# Altium footprint library IC.PcbLib: 163 footprints (part 2 of 11)
Each footprint in its own frame and in the unit in brackets; x right, y up, seen from the top. Pads: shape width x height; smd on the part's side, far side on the other; paste and mask are expansions set on the pad; w line width, h text height; cw(c..) or ccw(c..) is an arc to the next point about the centre after c.
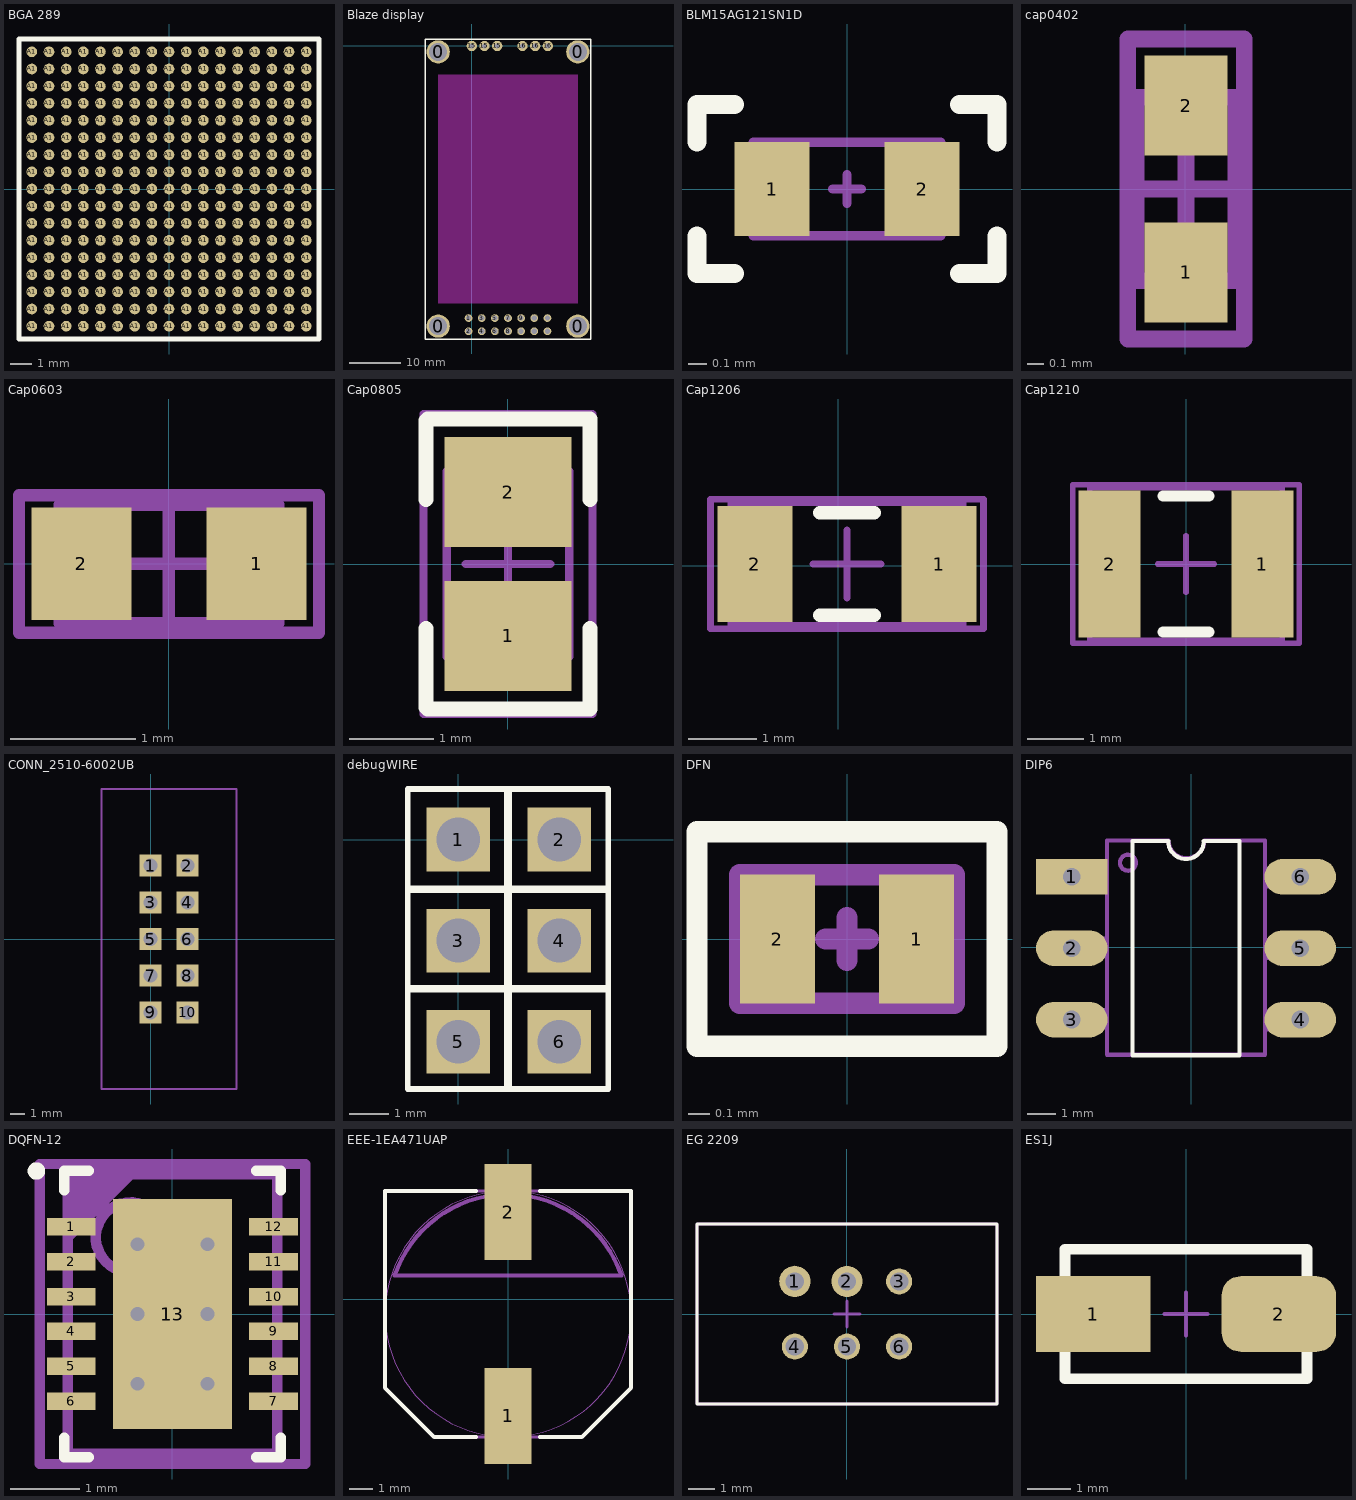
[diagram p1: the footprints below, top view; thin cyan lines are the x and y axes]

## BGA 289 [mm] "0.8mm pitch"
pads (289):
  round 0.5 smd: A1(-6.4,6.4) A1(-6.4,4.8) A1(-6.4,5.6) A1(-6.4,4) A1(-6.4,2.4) A1(-6.4,3.2) A1(-6.4,1.6) A1(-6.4,0.8) A1(-6.4,0) A1(-6.4,-1.6) A1(-6.4,-0.8) A1(-6.4,-2.4) A1(-6.4,-3.2) A1(-6.4,-4.8) A1(-6.4,-4) A1(-6.4,-5.6) A1(-6.4,-6.4) A1(-5.6,6.4) A1(-5.6,4.8) A1(-5.6,5.6) A1(-5.6,4) A1(-5.6,2.4) A1(-5.6,3.2) A1(-5.6,1.6) A1(-5.6,0) A1(-5.6,0.8) A1(-5.6,-0.8) A1(-5.6,-2.4) A1(-5.6,-1.6) A1(-5.6,-3.2) A1(-5.6,-4.8) A1(-5.6,-4) A1(-5.6,-5.6) A1(-5.6,-6.4) A1(-4.8,6.4) A1(-4.8,5.6) A1(-4.8,4) A1(-4.8,4.8) A1(-4.8,3.2) A1(-4.8,2.4) A1(-4.8,1.6) A1(-4.8,0) A1(-4.8,0.8) A1(-4.8,-0.8) A1(-4.8,-2.4) A1(-4.8,-1.6) A1(-4.8,-3.2) A1(-4.8,-4) A1(-4.8,-5.6) A1(-4.8,-4.8) A1(-4.8,-6.4) A1(-4,6.4) A1(-4,5.6) A1(-4,4) A1(-4,4.8) A1(-4,2.4) A1(-4,3.2) A1(-4,1.6) A1(-4,0.8) A1(-4,-0.8) A1(-4,0) A1(-4,-1.6) A1(-4,-2.4) A1(-4,-3.2) A1(-4,-4) A1(-4,-5.6) A1(-4,-4.8) A1(-4,-6.4) A1(-3.2,6.4) A1(-3.2,5.6) A1(-3.2,4.8) A1(-3.2,3.2) A1(-3.2,4) A1(-3.2,1.6) A1(-3.2,2.4) A1(-3.2,0.8) A1(-3.2,0) A1(-3.2,-1.6) A1(-3.2,-0.8) A1(-3.2,-2.4) A1(-3.2,-4) A1(-3.2,-3.2) A1(-3.2,-4.8) A1(-3.2,-5.6) A1(-3.2,-6.4) A1(-2.4,6.4) A1(-2.4,5.6) A1(-2.4,4.8) A1(-2.4,3.2) A1(-2.4,4) A1(-2.4,1.6) A1(-2.4,2.4) A1(-2.4,0.8) A1(-2.4,0) A1(-2.4,-1.6) A1(-2.4,-0.8) A1(-2.4,-2.4) A1(-2.4,-3.2) A1(-2.4,-4) A1(-2.4,-4.8) A1(-2.4,-6.4) A1(-2.4,-5.6) A1(-1.6,6.4) A1(-1.6,4.8) A1(-1.6,5.6) A1(-1.6,4) A1(-1.6,2.4) A1(-1.6,3.2) A1(-1.6,1.6) A1(-1.6,0) A1(-1.6,0.8) A1(-1.6,-0.8) A1(-1.6,-2.4) A1(-1.6,-1.6) A1(-1.6,-3.2) A1(-1.6,-4.8) A1(-1.6,-4) A1(-1.6,-5.6) A1(-1.6,-6.4) A1(-0.8,6.4) A1(-0.8,4.8) A1(-0.8,5.6) A1(-0.8,4) A1(-0.8,2.4) A1(-0.8,3.2) A1(-0.8,1.6) A1(-0.8,0) A1(-0.8,0.8) A1(-0.8,-0.8) A1(-0.8,-2.4) A1(-0.8,-1.6) A1(-0.8,-3.2) A1(-0.8,-4.8) A1(-0.8,-4) A1(-0.8,-5.6) A1(-0.8,-6.4) A1(0,6.4) A1(0,5.6) A1(0,4) A1(0,4.8) A1(0,3.2) A1(0,1.6) A1(0,2.4) A1(0,0.8) A1(0,-0.8) A1(0,0) A1(0,-1.6) A1(0,-2.4) A1(0,-3.2) A1(0,-4) A1(0,-5.6) A1(0,-4.8) A1(0,-6.4) A1(0.8,6.4) A1(0.8,5.6) A1(0.8,4) A1(0.8,4.8) A1(0.8,2.4) A1(0.8,3.2) A1(0.8,1.6) A1(0.8,0.8) A1(0.8,-0.8) A1(0.8,0) A1(0.8,-2.4) A1(0.8,-1.6) A1(0.8,-3.2) A1(0.8,-4) A1(0.8,-5.6) A1(0.8,-4.8) A1(0.8,-6.4) A1(1.6,6.4) A1(1.6,5.6) A1(1.6,4.8) A1(1.6,3.2) A1(1.6,4) A1(1.6,2.4) A1(1.6,0.8) A1(1.6,1.6) A1(1.6,0) A1(1.6,-0.8) A1(1.6,-2.4) A1(1.6,-1.6) A1(1.6,-3.2) A1(1.6,-4.8) A1(1.6,-4) A1(1.6,-5.6) A1(1.6,-6.4) A1(2.4,6.4) A1(2.4,5.6) A1(2.4,4.8) A1(2.4,3.2) A1(2.4,4) A1(2.4,2.4) A1(2.4,1.6) A1(2.4,0) A1(2.4,0.8) A1(2.4,-1.6) A1(2.4,-0.8) A1(2.4,-2.4) A1(2.4,-3.2) A1(2.4,-4.8) A1(2.4,-4) A1(2.4,-6.4) A1(2.4,-5.6) A1(3.2,6.4) A1(3.2,4.8) A1(3.2,5.6) A1(3.2,4) A1(3.2,2.4) A1(3.2,3.2) A1(3.2,1.6) A1(3.2,0.8) A1(3.2,0) A1(3.2,-1.6) A1(3.2,-0.8) A1(3.2,-2.4) A1(3.2,-3.2) A1(3.2,-4) A1(3.2,-4.8) A1(3.2,-6.4) A1(3.2,-5.6) A1(4,6.4) A1(4,4.8) A1(4,5.6) A1(4,4) A1(4,2.4) A1(4,3.2) A1(4,1.6) A1(4,0) A1(4,0.8) A1(4,-0.8) A1(4,-2.4) A1(4,-1.6) A1(4,-3.2) A1(4,-4.8) A1(4,-4) A1(4,-5.6) A1(4,-6.4) A1(4.8,6.4) A1(4.8,5.6) A1(4.8,4) A1(4.8,4.8) A1(4.8,3.2) A1(4.8,2.4) A1(4.8,1.6) A1(4.8,0) A1(4.8,0.8) A1(4.8,-0.8) A1(4.8,-2.4) A1(4.8,-1.6) A1(4.8,-3.2) A1(4.8,-4.8) A1(4.8,-4) A1(4.8,-5.6) A1(4.8,-6.4) A1(5.6,6.4) A1(5.6,5.6) A1(5.6,4) A1(5.6,4.8) A1(5.6,2.4) A1(5.6,3.2) A1(5.6,1.6) A1(5.6,0.8) A1(5.6,-0.8) A1(5.6,0) A1(5.6,-1.6) A1(5.6,-2.4) A1(5.6,-3.2) A1(5.6,-4) A1(5.6,-5.6) A1(5.6,-4.8) A1(5.6,-6.4) A1(6.4,5.6) A1(6.4,6.4) A1(6.4,4.8) A1(6.4,4) A1(6.4,2.4) A1(6.4,3.2) A1(6.4,1.6) A1(6.4,0.8) A1(6.4,-0.8) A1(6.4,0) A1(6.4,-1.6) A1(6.4,-2.4) A1(6.4,-3.2) A1(6.4,-4) A1(6.4,-5.6) A1(6.4,-4.8) A1(6.4,-6.4)
Top Overlay:
  lines w0.254: -7,-7 -7,7 7,7 7,-7 -7,-7

## Blaze display [mm]
pads (24):
  round 4.5 hole 3.5: 0(-6.5,-54.15) 0(-6.5,-1.15) 0(20.5,-54.15) 0(20.5,-1.15)
  round 1.5 hole 1: 1(-0.62,-52.61) 2(-0.62,-55.15) 3(1.92,-52.61) 4(1.92,-55.15) 5(4.46,-52.61) 6(4.46,-55.15) 7(7,-52.61) 8(7,-55.15) 9(9.54,-52.61) 10(9.54,-55.15) 11(12.08,-52.61) 12(12.08,-55.15) 13(14.62,-52.61) 14(14.62,-55.15)
  round 2 hole 1: 15(0,0) 15(2.45,0) 15(4.9,0) 16(9.8,0) 16(12.25,0) 16(14.7,0)
Top Overlay:
  lines w0.254: -9,-56.65 23,-56.65 23,1.35 -9,1.35 -9,-56.65
Keep-Out Layer:
  rectangle: -6.5,-49.75 20.5,-5.55
3D body: height 5, standoff 4, extent -9,-56.65 23,1.35
3D body: height 11, standoff -5, extent -6.5,-49.75 20.5,-5.55
3D body: height 11, standoff -5, extent 1.25,-41.562 12.75,-13.737

## BLM15AG121SN1D [mm]
pads (2):
  rect 0.4x0.5 smd: 1(-0.4,0) 2(0.4,0)
Top Overlay:
  lines w0.1: -0.8,-0.25 -0.8,-0.45 -0.6,-0.45 ; -0.8,0.25 -0.8,0.45 -0.6,0.45 ; 0.6,-0.45 0.8,-0.45 0.8,-0.25 ; 0.6,0.45 0.8,0.45 0.8,0.25
Mechanical 32:
  lines w0.05: -0.075,0 0.075,0 ; 0,-0.075 0,0.075 ; -0.5,-0.25 -0.5,0.25 0.5,0.25 0.5,-0.25 -0.5,-0.25
3D body: height 0.65, standoff 0.1, extent -0.5,-0.25 0.5,0.25

## cap0402 [mm]
pads (2):
  rect 0.5x0.6 smd: 1(0.004,-0.5) 2(0.004,0.5)
Mechanical 13:
  lines w0.1: -0.296,-0.55 -0.296,0.55 0.304,0.55 0.304,-0.55 -0.296,-0.55
Mechanical 15:
  lines w0.1: -0.296,0 0.304,0 ; 0.004,-0.3 0.004,0.3 ; -0.346,-0.9 -0.346,0.9 0.354,0.9 0.354,-0.9 -0.346,-0.9
3D body: height 1.3, standoff 0, extent -0.296,-0.55 0.304,0.55

## Cap0603 [mm]
pads (2):
  rect 0.8x0.9 smd: 1(0.7,0) 2(-0.7,0)
Mechanical 13:
  lines w0.1: -0.875,-0.475 0.875,-0.475 0.875,0.475 -0.875,0.475 -0.875,-0.475
Mechanical 15:
  lines w0.1: -0.475,0 0.475,0 ; 0,-0.475 0,0.475 ; -1.2,-0.55 1.2,-0.55 1.2,0.55 -1.2,0.55 -1.2,-0.55
3D body: height 1.3, standoff 0, extent -0.875,-0.475 0.875,0.475

## Cap0805 [mm]
pads (2):
  rect 1.5x1.3 smd: 1(0,-0.85) 2(0,0.85)
Top Overlay:
  lines w0.178: -0.968,-0.762 -0.968,-1.699 -0.95,-1.717 0.968,-1.717 0.968,-0.762 ; -0.968,0.762 -0.968,1.699 -0.95,1.717 0.968,1.717 0.968,0.762
Mechanical 5:
  lines w0.1: -1,-1.775 1,-1.775 1,1.775 -1,1.775 -1,-1.775
Mechanical 13:
  lines w0.1: -0.725,-0.65 0.725,-0.65 ; -0.725,0.65 0.725,0.65 ; -0.725,-1.1 0.725,-1.1 0.725,1.1 -0.725,1.1 -0.725,-1.1
Mechanical 15:
  lines w0.1: -0.5,0 0.5,0 ; 0,-0.5 0,0.5 ; -1,-1.775 1,-1.775 1,1.775 -1,1.775 -1,-1.775
3D body: height 1.1, standoff 0, extent -0.724,0.651 0.724,1.099
3D body: height 1.1, standoff 0, extent -0.724,-0.649 0.724,0.649
3D body: height 1.1, standoff 0, extent -0.724,-1.099 0.724,-0.651

## Cap1206 [mm]
pads (2):
  rect 1.1x1.7 smd: 1(1.475,0.025) 2(-1.225,0.025)
Top Overlay:
  lines w0.2: -0.275,-0.725 0.525,-0.725 ; -0.275,0.775 0.525,0.775
Mechanical 13:
  lines w0.1: -1.575,-0.875 -1.575,0.925 1.825,0.925 1.825,-0.875 -1.575,-0.875
Mechanical 15:
  lines w0.1: -0.375,0.025 0.625,0.025 ; 0.125,-0.475 0.125,0.525 ; -1.875,-0.925 -1.875,0.975 2.125,0.975 2.125,-0.925 -1.875,-0.925
3D body: height 1.3, standoff 0, extent -1.575,-0.875 1.825,0.925

## Cap1210 [mm]
pads (2):
  rect 1.1x2.6 smd: 1(1.35,0) 2(-1.35,0)
Top Overlay:
  lines w0.2: -0.4,-1.2 0.4,-1.2 ; -0.4,1.2 0.4,1.2
Mechanical 13:
  lines w0.1: -1.7,-1.35 1.7,-1.35 1.7,1.35 -1.7,1.35 -1.7,-1.35
Mechanical 15:
  lines w0.1: -0.5,0 0.5,0 ; 0,-0.5 0,0.5 ; -2,-1.4 2,-1.4 2,1.4 -2,1.4 -2,-1.4
3D body: height 1.3, standoff 0, extent -1.7,-1.35 1.7,1.35

## CONN_2510-6002UB [mil]
pads (10):
  rect 60x60 hole 38: 1(0,200) 2(100,200) 3(0,100) 4(100,100) 5(0,0) 6(100,0) 7(0,-100) 8(100,-100) 9(0,-200) 10(100,-200)
Mechanical 5:
  lines w5: -134,-409 234,-409 234,409 -134,409 -134,-409
  text "*" at -85,249 h40
  text ".Designator" at 31,77 h40

## debugWIRE [mm]
pads (6):
  rect 1.6x1.6 hole 1.1: 1(0,0) 2(2.54,0) 3(0,-2.54) 4(2.54,-2.54) 5(0,-5.08) 6(2.54,-5.08)
Top Overlay:
  lines w0.15: -1.27,-6.27 1.27,-6.27 1.27,-3.73 -1.27,-3.73 -1.27,-6.27 ; -1.27,-3.77 1.27,-3.77 1.27,-1.23 -1.27,-1.23 -1.27,-3.77 ; -1.27,-1.27 1.27,-1.27 1.27,1.27 -1.27,1.27 -1.27,-1.27 ; 1.23,-6.27 3.77,-6.27 3.77,-3.73 1.23,-3.73 1.23,-6.27 ; 1.23,-3.77 3.77,-3.77 3.77,-1.23 1.23,-1.23 1.23,-3.77 ; 1.23,-1.27 3.77,-1.27 3.77,1.27 1.23,1.27 1.23,-1.27
3D body "PLS-1.STEP": height 8.5, standoff -3, extent 1.23,-6.27 3.77,-3.73
3D body "PLS-1.STEP": height 8.5, standoff -3, extent -1.27,-6.27 1.27,-3.73
3D body "PLS-1.STEP": height 8.5, standoff -3, extent 1.23,-3.77 3.77,-1.23
3D body "PLS-1.STEP": height 8.5, standoff -3, extent -1.27,-3.77 1.27,-1.23
3D body "PLS-1.STEP": height 8.5, standoff -3, extent 1.23,-1.27 3.77,1.27
3D body "PLS-1.STEP": height 8.5, standoff -3, extent -1.27,-1.27 1.27,1.27

## DFN [mm]
pads (2):
  rect 0.35x0.6 smd: 1(0.325,0) 2(-0.325,0)
Top Overlay:
  lines w0.1: -0.7,-0.5 0.7,-0.5 0.7,0.5 -0.7,0.5 -0.7,-0.5
Mechanical 32:
  lines w0.1: -0.1,0 0.1,0 ; 0,-0.1 0,0.1 ; -0.5,-0.3 0.5,-0.3 0.5,0.3 -0.5,0.3 -0.5,-0.3
3D body: height 0.4, standoff 0.1, extent -0.5,-0.3 0.5,0.3

## DIP6 [mm]
pads (6):
  rect 2.54x1.27 hole 0.635: 1(-4.25,2.5)
  oval 2.54x1.27 hole 0.635: 2(-4.25,-0.04) 3(-4.25,-2.58) 4(3.878,-2.58) 5(3.878,-0.04) 6(3.878,2.5)
Top Overlay:
  lines w0.15: -2.091,-3.85 -2.091,3.77 -0.821,3.77 ccw(c-0.186,3.77) 0.449,3.77 1.719,3.77 1.719,-3.85 -2.091,-3.85
Mechanical 29:
  circle w0.15: c-2.25,3 r0.283
  lines w0.15: -2.997,-2.86 -4.822,-2.86 -4.822,-2.235 -2.997,-2.235 ; -2.997,-0.32 -4.822,-0.32 -4.822,0.305 -2.997,0.305 ; -2.997,2.22 -4.822,2.22 -4.822,2.845 -2.997,2.845 ; 2.625,-2.925 4.45,-2.925 4.45,-2.3 2.625,-2.3 ; 2.625,-0.385 4.45,-0.385 4.45,0.24 2.625,0.24 ; 2.625,2.155 4.45,2.155 4.45,2.78 2.625,2.78 ; -2.997,-3.83 -2.997,3.79 -0.806,3.79 ccw(c-0.171,3.79) 0.464,3.79 2.625,3.79 2.625,-3.83 -2.997,-3.83
  text ".Designator" at -2.55,-0.3 h1
3D body "User Library-DIP6.STEP": height 4.8, standoff -2.5, extent -4.121,-3.604 3.749,3.516

## DQFN-12 [mm] "SON, 12-Leads, Body 4x3mm, Pitch 0.5mm, Thermal Pad 3.3x1.7mm"
height 0.8
pads (13):
  rect 0.7x0.25 smd: 1(-1.45,1.25) 2(-1.45,0.75) 3(-1.45,0.25) 4(-1.45,-0.25) 5(-1.45,-0.75) 6(-1.45,-1.25) 7(1.45,-1.25) 8(1.45,-0.75) 9(1.45,-0.25) 10(1.45,0.25) 11(1.45,0.75) 12(1.45,1.25)
  rect 1.7x3.3 smd: 13(0,0)
via -0.5,1 diameter 0.5 hole 0.2
via 0.5,1 diameter 0.5 hole 0.2
via -0.5,0 diameter 0.5 hole 0.2
via 0.5,0 diameter 0.5 hole 0.2
via -0.5,-1 diameter 0.5 hole 0.2
via 0.5,-1 diameter 0.5 hole 0.2
Top Overlay:
  circle w0.15: c-1.95,2.05 r0.05
  lines w0.15: -1.55,-1.775 -1.55,-2.05 -1.2,-2.05 ; -1.55,1.775 -1.55,2.05 -1.2,2.05 ; 1.2,-2.05 1.55,-2.05 1.55,-1.775 ; 1.2,2.05 1.55,2.05 1.55,1.775
Mechanical 13:
  circle w0.15: c-0.6,1.1 r0.5
Mechanical 15:
  lines w0.15: -0.5,0 0.5,0 ; 0,-0.5 0,0.5 ; -1.9,-2.15 -1.9,2.15 1.9,2.15 1.9,-2.15 -1.9,-2.15
Mechanical 29:
  region: -1.5,1 -1.5,2 -0.5,2
  lines w0.15: -1.5,-2 -1.5,2 ; -1.5,-2 1.5,-2 ; -1.5,-2 1.5,-2 ; -1.5,-2 -1.5,2 ; -1.5,2 1.5,2 ; -1.5,2 1.5,2 ; 1.5,-2 1.5,2 ; 1.5,-2 1.5,2
  text ".Designator" at -1.4,-0.5 h1
3D body: height 0.8, standoff 0, extent -1.5,-2 1.5,2

## EEE-1EA471UAP [mm]
height 0.762
pads (2):
  rect 2x4.1 smd: 1(0,-4.985) 2(0,3.715)
Top Overlay:
  lines w0.178: -5.253,4.615 -1.366,4.615 ; -5.25,4.616 -5.25,-3.785 -3.15,-5.885 -1.362,-5.885 ; 1.362,-5.885 3.15,-5.885 5.25,-3.785 5.25,4.616 ; 1.366,4.615 5.253,4.615
Mechanical 5:
  lines w0.127: -5.253,4.615 5.25,4.615 ; -5.25,4.616 -5.25,-3.785 -3.15,-5.885 3.15,-5.885 5.25,-3.785 5.25,4.616
Mechanical 13:
  circle w0.001: c0,-0.635 r5.25
  lines w0.178: -4.837,1.007 4.836,1.007 ; -4.837,1.003 cw(c0,-0.635) 4.836,1.006
3D body: height 10.5, standoff 0.1, extent -5.249,-5.884 5.249,4.614
3D body: height 0.6, standoff 0, extent -5.253,-5.886 5.253,4.617
3D body: height 10.5, standoff 10.4, extent -4.835,1.007 4.835,4.471

## EG 2209 [mm]
pads (6):
  round 1.2 hole 0.7: 1(-2,1.25) 2(0,1.25)
  round 1 hole 0.7: 3(2,1.25) 4(-2,-1.25) 5(0,-1.25) 6(2,-1.25)
Top Overlay:
  lines w0.1: -5.75,-3.45 5.75,-3.45 5.75,3.45 -5.75,3.45 -5.75,-3.45
Mechanical 32:
  lines w0.1: -0.5,0 0.5,0 ; 0,-0.5 0,0.5 ; -5.75,-3.45 5.75,-3.45 5.75,3.45 -5.75,3.45 -5.75,-3.45
3D body: height 12.5, standoff 8.5, extent 0,-1 2,1
3D body: height 3.7, standoff 0.2, extent -2.297,-1.549 -1.7,-0.95
3D body: height 3.7, standoff 0.2, extent -0.297,-1.549 0.3,-0.95
3D body: height 3.7, standoff 0.2, extent 1.703,-1.549 2.3,-0.95
3D body: height 3.7, standoff 0.2, extent 1.703,0.951 2.3,1.55
3D body: height 3.7, standoff 0.2, extent -0.297,0.951 0.3,1.55
3D body: height 3.7, standoff 0.2, extent -2.297,0.951 -1.7,1.55
3D body: height 8.5, standoff 3.5, extent -5.75,-3.45 5.75,3.45

## ES1J [mm]
pads (2):
  rect 2.65x1.75 smd: 1(-2.15,0)
  rrect50% 2.65x1.75 smd: 2(2.15,0)
Top Overlay:
  lines w0.254: -2.8,-1.5 -2.8,0 -2.8,1.5 0,1.5 2.8,1.5 2.8,0 2.8,-1.5 0,-1.5 -2.8,-1.5
Mechanical 15:
  lines w0.1: -0.5,0 0,0 ; 0,-0.5 0,0 ; 0,0.5 0,0 ; 0.5,0 0,0
3D body: height 2.2, standoff 0.3, extent -2.8,-1.5 2.8,1.5
3D body: height 0.1, standoff 0, extent -3,-0.8 -2.25,0.8
3D body: height 0.1, standoff 0, extent 2.25,-0.8 3,0.8
3D body: height 1.2, standoff 0.1, extent 2.875,-0.8 3,0.8
3D body: height 1.2, standoff 0.1, extent -3,-0.8 -2.875,0.8
3D body: height 1.2, standoff 1.1, extent -3,-0.8 -2.25,0.8
3D body: height 1.2, standoff 1.1, extent 2.25,-0.8 3,0.8